# Altium footprint library Components_Footprints.PcbLib: 29 footprints (part 1 of 2)
Each footprint in its own frame and in the unit in brackets; x right, y up, seen from the top. Pads: shape width x height; smd on the part's side, far side on the other; paste and mask are expansions set on the pad; w line width, h text height; cw(c..) or ccw(c..) is an arc to the next point about the centre after c.
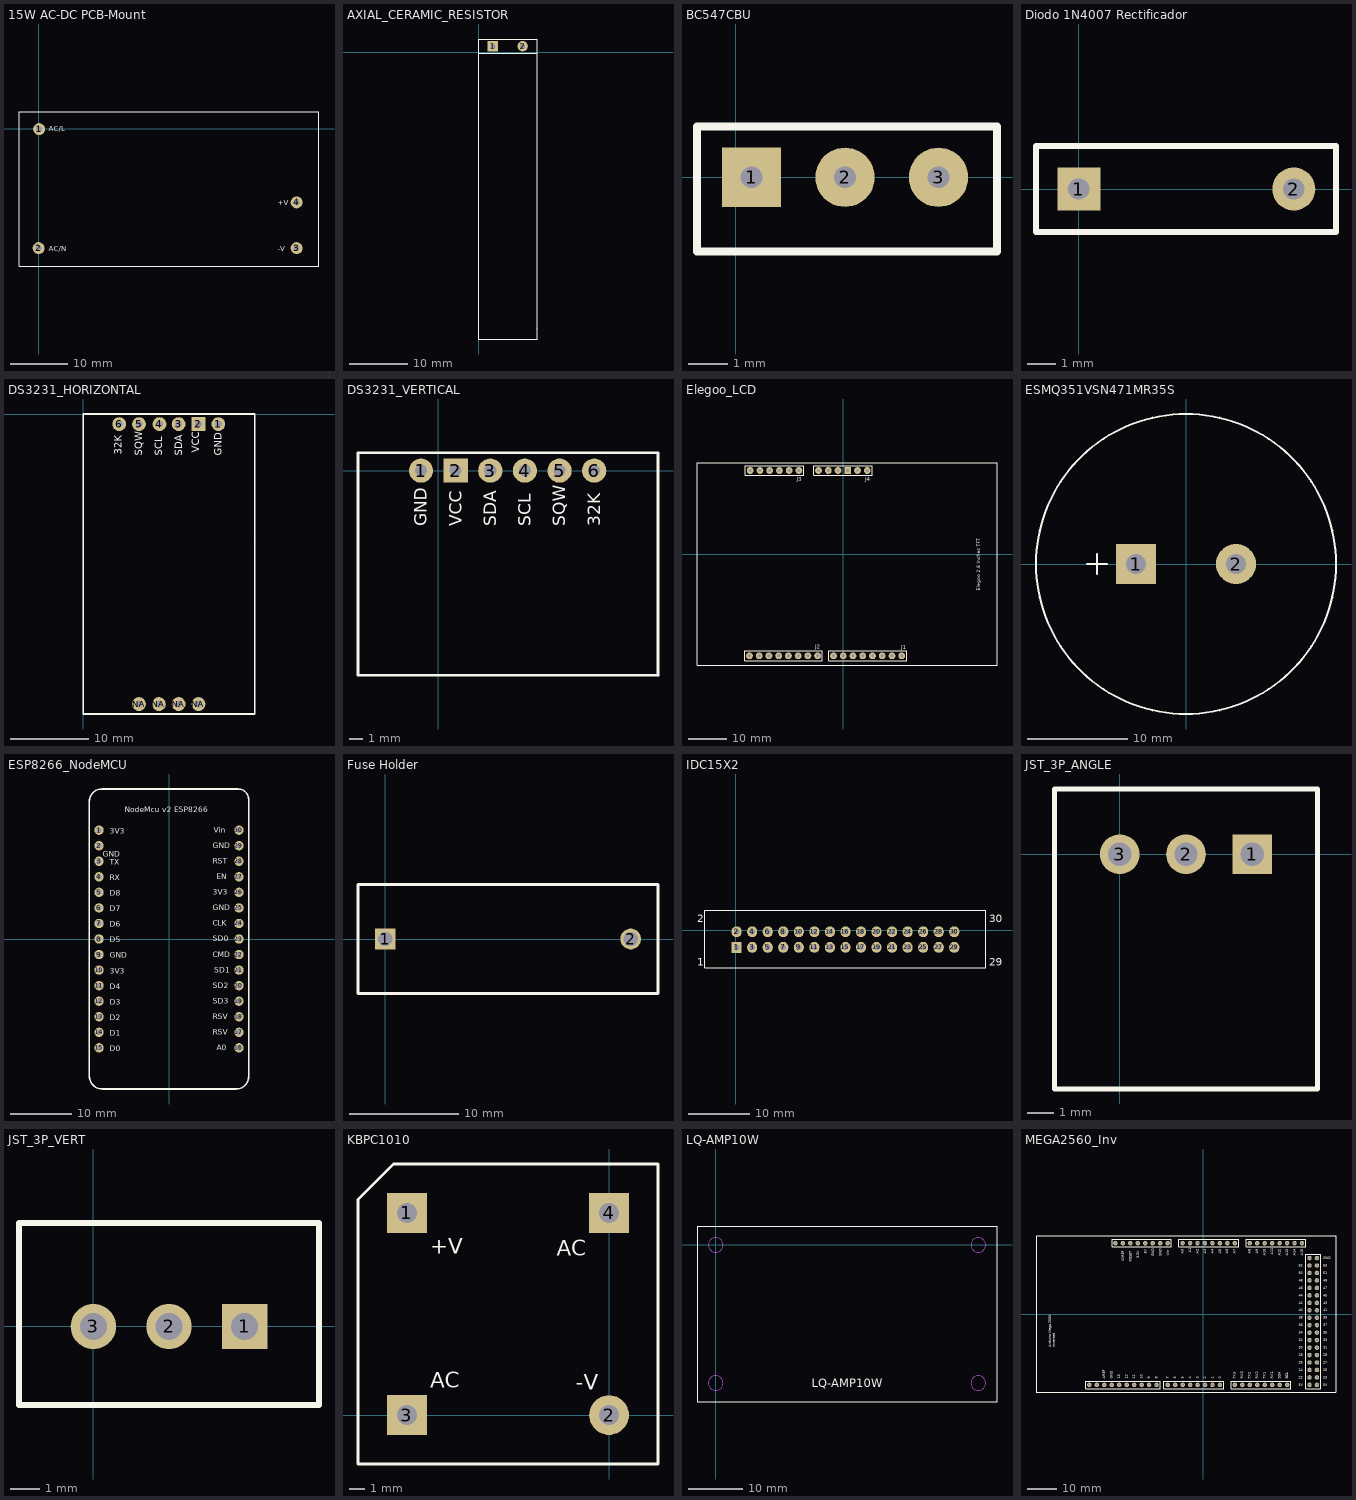
[diagram p0: the footprints below, top view; thin cyan lines are the x and y axes]

## 15W AC-DC PCB-Mount [mil]
height 944.88
pads (4):
  round 82 hole 41: 1(3.35,-1.1) 2(0,-820) 3(1775,-820) 4(1775,-505.04)
Top Overlay:
  lines w8: -135,-945.98 1929.13,-945.98 1929.13,120 -135,120 -135,-945.98
  text "+V" at 1645,-525 h36
  text "-V" at 1645,-840 h36
  text "AC/N" at 70,-840 h36
  text "AC/L" at 70,-15 h36
3D body "Mean Well IRM-20.stp": height 944.88, standoff -98.43, extent -133.86,-945.98 1929.13,124.88

## AXIAL_CERAMIC_RESISTOR [mil] "Axial Ceramic Resistor"
pads (2):
  rect 70x70 hole 35: 1(95.5,40.87)
  round 70 hole 35: 2(295.5,40.87)
Top Overlay:
  lines w8: 393,89.37 0,89.37 0,-5.63 ; 394,-10.63 394,89.37 ; 0,-5.63 0,-1929.13 393.7,-1929.13 393.7,-5.63 0,-5.63
Mechanical 1:
  lines w8: 392.01,-1856.02 393.7,-1854.33
3D body "RESAD5500W80L5000D930.stp": height 356.3, standoff -102.36, extent 16.93,-2028.42 383.07,168.43

## BC547CBU [mil]
pads (3):
  rect 60x60 hole 22.05: 1(15.75,0)
  round 60 hole 22.05: 2(110.24,0) 3(204.72,0)
Top Overlay:
  lines w8: -39.37,-74.8 263.78,-74.8 263.78,0 263.78,51.18 -39.37,51.18 -39.37,0 -39.37,-74.8
3D body "BC547.STEP": height 298.43, standoff -96.87, extent 1.19,-77.95 219.3,40.16

## Diodo 1N4007 Rectificador [mil]
pads (2):
  rect 60x60 hole 30: 1(0,0)
  round 60 hole 30: 2(300,0)
Top Overlay:
  lines w8: -60,-60 358.96,-60 358.96,60 -60,60 -60,-60
3D body "diode 1N4001.step": height 99.94, standoff -87.8, extent -10.16,-49 310.16,50.68

## DS3231_HORIZONTAL [mil]
height 393.7
pads (10):
  round 70 hole 35: 1(681.89,-51.18) 3(481.89,-51.18) 4(385,-51.18) 5(281.89,-51.18) 6(181.89,-51.18) NA(281.89,-1463.86) NA(381.89,-1463.86) NA(481.89,-1463.86) NA(581.89,-1463.86)
  rect 70x70 hole 35: 2(581.89,-51.18)
Top Overlay:
  lines w8: 0,-1513.86 866.14,-1513.86 866.14,0 0,0 0,-1513.86
  text "GND" at 698.89,-211.51 h36
  text "VCC" at 585,-195 h36
  text "SDA" at 498.89,-211.51 h36
  text "SCL" at 398.89,-211.51 h36
  text "SQW" at 298.89,-211.51 h36
  text "32K" at 195,-205 h36
Mechanical 1:
  lines w8: 866.14,-641.73 866.14,-641.73
3D body "4-Pin Header - Male - 2.54mm.step": height 405, standoff -65, extent 230,-1515.79 630,-1415.79
3D body "DS3231 Timer Assembly.stp": height 659.13, standoff -34.96, extent -30,-1504.72 828.27,4.72
3D body "6-Pin Header - Female - 2.54mm.step": height 196.85, standoff -118.11, extent 120.16,-98.43 739.84,0
3D body "4-Pin Header - Female - 2.54mm.step": height 196.85, standoff -118.11, extent 220.16,-1515 639.84,-1416.57

## DS3231_VERTICAL [mil] "RTC Module"
pads (6):
  round 70 hole 35: 1(-50.39,0) 3(149.61,0) 4(249.61,0) 5(349.61,0) 6(449.61,0)
  rect 70x70 hole 35: 2(49.61,0)
Top Overlay:
  lines w8: -232.28,-590.55 633.86,-590.55 633.86,51.18 -232.28,51.18 -232.28,-590.55
  text "32K" at 466.61,-160.33 h36
  text "SQW" at 366.61,-160.33 h36
  text "SCL" at 266.61,-160.33 h36
  text "SDA" at 166.61,-160.33 h36
  text "VCC" at 66.61,-160.33 h36
  text "GND" at -33.39,-161.31 h36
Mechanical 1:
  lines w8: 633.86,-590.55 633.86,-590.55
3D body "DS3231.step": height 1547.24, standoff -214.57, extent -248.03,-515.15 649.61,17.53

## Elegoo_LCD [mil]
pads (28):
  round 70 hole 35: 1(598.31,-1040.12) 2(498.31,-1040.12) 3(398.31,-1040.12) 4(298.31,-1040.12) 5(198.31,-1040.12) 6(98.31,-1040.12) 7(-1.69,-1040.12) 8(-101.69,-1040.12) 9(-264.69,-1040.12) 10(-364.69,-1040.12) 11(-464.69,-1040.12) 12(-564.69,-1040.12) 13(-664.69,-1040.12) 14(-764.69,-1040.12) 15(-864.69,-1040.12) 16(-964.69,-1040.12) 17(-956.81,862.24) 18(-856.81,862.24) 19(-756.81,862.24) 20(-656.81,862.24) 21(-556.81,862.24) 22(-456.81,862.24) 23(-255.24,862.24) 24(-155.24,862.24) 25(-55.24,862.24) 27(144.76,862.24) 28(244.76,862.24)
  rect 70x70 hole 35: 26(44.76,862.24)
Top Overlay:
  lines w8: -1502.87,-1135 -1502.87,939.8 1576.65,939.8 1576.65,-1135 -1502.87,-1135 ; -1014.69,-1090.12 -1014.69,-990.12 -214.69,-990.12 -214.69,-1090.12 -1014.69,-1090.12 ; -1006.81,812.24 -406.81,812.24 -406.81,912.24 -1006.81,912.24 -1006.81,812.24 ; -305.24,812.24 294.76,812.24 294.76,912.24 -305.24,912.24 -305.24,812.24 ; -151.69,-1090.12 -151.69,-990.12 648.31,-990.12 648.31,-1090.12 -151.69,-1090.12
  text "Elegoo 2.8 Inches TFT" at 1420,-372.38 h60
  text "J2" at -288.19,-968.94 h40
  text "J4" at 221.81,751.06 h40
  text "J3" at -478.19,751.06 h40
  text "J1" at 591.81,-973.94 h40
3D body "Female Pin Header 01x06 Pitch 2.54mm Height 8.5mm.stp": height 334.65, standoff -125.98, extent -1004.72,813.39 -404.72,913.39
3D body "Female Pin Header 01x06 Pitch 2.54mm Height 8.5mm.stp": height 334.65, standoff -125.98, extent -303.15,813.39 296.85,913.39
3D body "Female Pin Header 01x08 Pitch 2.54mm Height 8.5mm.stp": height 334.65, standoff -125.98, extent -1014.69,-1089.37 -214.69,-989.37
3D body "Female Pin Header 01x08 Pitch 2.54mm Height 8.5mm.stp": height 334.65, standoff -125.98, extent -151.69,-1089.37 648.31,-989.37
3D body "Elegoo_2.8_TFT_LCD_Display.stp": height 748.03, standoff 82.68, extent -1482.28,-1135.82 1600.39,946.86

## ESMQ351VSN471MR35S [mm] "CAP ALUM 470UF 20% 350V SNAP"
height 35
pads (2):
  rect 4x4 hole 2: 1(-5,0)
  round 4 hole 2: 2(5,0)
Top Overlay:
  circle w0.203: c0,0 r15
  lines w0.203: -9.89,0 -7.89,0 ; -8.89,-1 -8.89,1
3D body "Snap-Cap 30mm W x 35mm H 10mm pitch.step": height 35, standoff -6.2, extent -21.131,-21.131 21.132,21.132

## ESP8266_NodeMCU [mil]
pads (30):
  round 60 hole 35: 1(-450,700) 2(-450,600) 3(-450,500) 4(-450,400) 5(-450,300) 6(-450,200) 7(-450,100) 8(-450,0) 9(-450,-100) 10(-450,-200) 11(-450,-300) 12(-450,-400) 13(-450,-500) 14(-450,-600) 15(-450,-700) 16(450,-700) 17(450,-600) 18(450,-500) 19(450,-400) 20(450,-300) 21(450,-200) 22(450,-100) 23(450,0) 24(450,100) 25(450,200) 26(450,300) 27(450,400) 28(450,500) 29(450,600) 30(450,700)
Top Overlay:
  lines w10: 440.94,964.57 -433.07,964.57 ccw(c-433.07,885.83) -511.81,885.83 -511.81,-881.89 ccw(c-429.13,-881.89) -429.13,-964.57 433.07,-964.57 ccw(c433.07,-885.83) 511.81,-885.83 511.81,893.7 ; 444.88,964.57 cw(c444.88,897.64) 511.81,897.64
  text "NodeMcu v2 ESP8266" at -285,815 h36
  text "Vin" at 286.42,684 h36
  text "GND" at 282.49,584 h36
  text "RST" at 282.49,484 h36
  text "EN" at 306.1,384 h36
  text "3V3" at 282.49,284 h36
  text "GND" at 282.49,184 h36
  text "CLK" at 282.49,84 h36
  text "SD0" at 282.49,-16 h36
  text "CMD" at 282.49,-116 h36
  text "SD1" at 290.36,-216 h36
  text "SD2" at 282.49,-316 h36
  text "SD3" at 282.49,-416 h36
  text "RSV" at 282.49,-516 h36
  text "RSV" at 282.49,-616 h36
  text "A0" at 306.1,-716 h36
  text "D0" at -381,-722 h36
  text "D1" at -381,-622 h36
  text "D2" at -381,-522 h36
  text "D3" at -381,-422 h36
  text "D4" at -381,-322 h36
  text "3V3" at -381,-222 h36
  text "GND" at -381,-122 h36
  text "D5" at -381,-22 h36
  text "D6" at -381,78 h36
  text "D7" at -381,178 h36
  text "D8" at -381,278 h36
  text "RX" at -381,378 h36
  text "TX" at -381,478 h36
  text "GND" at -426,528 h36
  text "3V3" at -381,678 h36
3D body "15-Pin Header - Female - 2.54mm.step": height 196.85, standoff -118.11, extent 400.79,-759.84 499.21,759.85
3D body "15-Pin Header - Female - 2.54mm.step": height 196.85, standoff -118.11, extent -499.21,-759.84 -400.79,759.85
3D body "ESP8266.stp": height 505.63, standoff -49.1, extent -510,-952.05 495.9,970

## Fuse Holder [mm]
pads (2):
  rect 1.9x1.9 hole 1.3: 1(0,0)
  round 1.9 hole 1.3: 2(22.5,0)
Top Overlay:
  lines w0.254: -2.5,-5 -2.5,5 0,5 22.5,5 25,5 25,-5 22.5,-5 0,-5 -2.5,-5
3D body "FUSE-0031.8201.stp": height 11.5, standoff -4, extent -0.55,-4.8 22.55,4.8

## IDC15X2 [mil]
pads (30):
  rect 65x70 hole 35.43: 1(5,-110)
  oval 65x70 hole 35.43: 2(5,-10) 3(105,-110) 4(105,-10) 5(205,-110) 6(205,-10) 7(305,-110) 8(305,-10) 9(405,-110) 10(405,-10) 11(505,-110) 12(505,-10) 13(605,-110) 14(605,-10) 15(705,-110) 16(705,-10) 17(805,-110) 18(805,-10) 19(905,-110) 20(905,-10) 21(1005,-110) 22(1005,-10) 23(1105,-110) 24(1105,-10) 25(1205,-110) 26(1205,-10) 27(1305,-110) 28(1305,-10) 29(1405,-110) 30(1405,-10)
Top Overlay:
  lines w7.87: -198.54,-240 -198.54,127 1608.54,127 1608.54,-240 -198.54,-240
  text "29" at 1630,-230 h50
  text "30" at 1630,50 h50
  text "2" at -250,50 h50
  text "1" at -250,-230 h50
3D body "DS1013-30S (IDC-30MS CONNFLY).step": height 354.33, standoff -141.73, extent -197.54,-232.39 1609.54,118

## JST_3P_ANGLE [mil] "JST-XH Through Hole Right Angle Connectors"
height 240.16
pads (3):
  rect 60x60 hole 35.43: 1(200,0)
  round 60 hole 35.43: 2(100,0) 3(0,0)
Top Overlay:
  lines w8: -98.43,-354.33 -98.43,98.43 298.43,98.43 298.43,-354.33 -98.43,-354.33
3D body "S3B-XH-A.stp": height 240.16, standoff -133.86, extent -95,-361.38 294.77,91.38
3D body: height 10, standoff 0, extent 100,-70 100,-70

## JST_3P_VERT [mil] "JST-XH Through Hole Right Angle Connectors"
height 240.16
pads (3):
  rect 60x60 hole 35.43: 1(200,0)
  round 60 hole 35.43: 2(100,0) 3(0,0)
Top Overlay:
  lines w8: -98.43,-104 298.43,-104 298.43,137 -98.43,137 -98.43,-104
3D body: height 10, standoff 0, extent 100,-70 100,-70
3D body "JST - XH - Thru V - 3Pin - 2.54mm.stp": height 284, standoff -118, extent -91.99,-98 292.01,132

## KBPC1010 [mm] "Single-Phase Silicon Bridge Rectifier Rectifier"
pads (4):
  rect 2.6x2.6 hole 1.3: 1(-13.2,13.2) 3(-13.2,0) 4(0,13.2)
  round 2.6 hole 1.3: 2(0,0)
Top Overlay:
  lines w0.203: -16.4,-3.2 -16.4,14.08 -14.08,16.4 3.2,16.4 3.2,-3.2 ; -16.375,-3.2 3.175,-3.2
  text "-V" at -2.159,1.651 h1.02
  text "AC" at -11.684,1.778 h1.02
  text "AC" at -3.429,10.414 h1.02
  text "+V" at -11.684,10.541 h1.02
3D body "KBPC1010.step": height 9.5, standoff -17.1, extent -16.404,-3.323 3.196,16.277

## LQ-AMP10W [mil]
Top Overlay:
  lines w8: -135,-1135.04 -135,135.04 2035.04,135.04 2035.04,-1135.04 -135,-1135.04
  text "LQ-AMP10W" at 695.1,-1029.99 h60
Mechanical 1:
  circle w8: c0.04,-1000.04 r53.15
  circle w8: c1900.04,-1000 r53.15
  circle w8: c1900,0.04 r53.15
  circle w8: c0,-1000 r53.15
  circle w8: c1900,-1000 r53.15
  circle w8: c1900,0 r53.15
  circle w8: c0,0 r53.15

## MEGA2560_Inv [mil] "Arduino Mega 2560 Inverted"
pads (86):
  round 60 hole 35: 0(225,-949.39) 1(125,-949.39) 2(25,-949.39) 3(-75,-949.39) 3.3V(-875.94,949.39) 4(-175,-949.39) 5(-275,-949.39) 5V(-775.94,949.39) 5V_1(1425,-949.39) 5V_2(1525,-949.39) 6(-375,-949.39) 7(-475,-949.39) 8(-625,-949.39) 9(-725,-949.39) 10(-825,-949.39) 11(-925,-949.39) 12(-1025,-949.39) 13(-1125,-949.39) 22(1425,-849.39) 23(1525,-849.39) 24(1425,-749.39) 25(1525,-749.39) 26(1425,-649.39) 27(1525,-649.39) 28(1425,-549.39) 29(1525,-549.39) 30(1425,-449.39) 31(1525,-449.39) 32(1425,-349.39) 33(1525,-349.39) 34(1425,-249.39) 35(1525,-249.39) 36(1425,-149.39) 37(1525,-149.39) 38(1425,-49.39) 39(1525,-49.39) 40(1425,50.61) 41(1525,50.61) 42(1425,150.61) 43(1525,150.61) 44(1425,250.61) 45(1525,250.61) 46(1425,350.61) 47(1525,350.61) 48(1425,450.61) 49(1525,450.61) 50(1425,550.61) 51(1525,550.61) 52(1425,650.61) 53(1525,650.61) A0(-275.94,949.39) A1(-175.94,949.39) A2(-75.94,949.39) A3(24.06,949.39) A4(124.06,949.39) A5(224.06,949.39) A6(324.06,949.39) A7(424.06,949.39) A8(624.06,949.39) A9(724.06,949.39) A10(824.06,949.39) A11(924.06,949.39) A12(1024.06,949.39) A13(1124.06,949.39) A14(1224.06,949.39) A15(1324.06,949.39) AREF(-1325,-949.39) GND(-575.94,949.39) GND_1(-675.94,949.39) GND_2(-1225,-949.39) GND_3(1425,750.61) GND_4(1525,750.61) IOREF(-1075.94,949.39) LCD(-1425,-949.39) LCD_1(-1525,-949.39) NA(-1175.94,949.39) RESET(-975.94,949.39) RX1(925,-949.39) RX2(725,-949.39) RX3(525,-949.39) SCL(1125,-949.39) SDA(1025,-949.39) TX1(825,-949.39) TX2(625,-949.39) TX3(425,-949.39) Vin(-475.94,949.39)
Top Overlay:
  lines w8: 1374.06,699.39 1374.06,799.39 ; -2240,-1049.39 -2240,1050.61 1780,1050.61 1780,-1049.39 -2240,-1049.39 ; -1575.94,-999.39 -1575.94,-899.39 -575,-899.39 -575,-999.39 -1575.94,-999.39 ; -1220.94,899.39 -1220.94,999.39 -425.94,999.39 -425.94,899.39 -1220.94,899.39 ; -525,-999.39 -525,-899.39 275,-899.39 275,-999.39 -525,-999.39 ; -325.94,899.39 -325.94,999.39 474.06,999.39 474.06,899.39 -325.94,899.39 ; 375,-999.39 1175,-999.39 1175,-899.39 375,-899.39 375,-999.39 ; 574.06,899.39 574.06,999.39 1374.06,999.39 1374.06,899.39 574.06,899.39 ; 1375,-999.39 1375,800.61 1575,800.61 1575,-999.39 1375,-999.39
  text "Arduino Mega 2560  / Inverted" at -1985,-446.75 h36
  text "5V" at 1609.06,-965.61 h36
  text "53" at 1609.06,634.39 h36
  text "51" at 1609.06,534.39 h36
  text "49" at 1609.06,434.39 h36
  text "47" at 1609.06,334.39 h36
  text "45" at 1609.06,234.39 h36
  text "43" at 1609.06,134.39 h36
  text "41" at 1609.06,34.39 h36
  text "39" at 1609.06,-65.61 h36
  text "37" at 1609.06,-165.61 h36
  text "35" at 1609.06,-265.61 h36
  text "33" at 1609.06,-365.61 h36
  text "31" at 1609.06,-465.61 h36
  text "29" at 1609.06,-565.61 h36
  text "27" at 1609.06,-665.61 h36
  text "25" at 1609.06,-765.61 h36
  text "23" at 1609.06,-865.61 h36
  text "GND" at 1609.06,734.39 h36
  text "A15" at 1339.06,780.55 h36
  text "A14" at 1239.06,780.55 h36
  text "A13" at 1139.06,780.55 h36
  text "A12" at 1039.06,780.55 h36
  text "A11" at 939.06,792.55 h36
  text "A10" at 839.06,780.55 h36
  text "A9" at 739.06,810.54 h36
  text "A8" at 639.06,810.54 h36
  text "A0" at -260.94,810.54 h36
  text "A7" at 439.06,810.54 h36
  text "A6" at 339.06,810.54 h36
  text "A5" at 239.06,810.54 h36
  text "A4" at 139.06,810.54 h36
  text "A3" at 39.06,810.54 h36
  text "A2" at -60.94,810.54 h36
  text "A1" at -160.94,822.54 h36
  text "IOREF" at -1056.89,708.58 h36
  text "Vin" at -456.89,780.55 h36
  text "GND" at -556.89,774.56 h36
  text "GND" at -656.89,774.56 h36
  text "5V" at -756.89,810.54 h36
  text "3.3V" at -856.89,744.57 h36
  text "RESET" at -956.89,702.58 h36
  text "SCL" at 1139.06,-865.61 h36
  text "SCL" at 1139.06,-865.61 h36
  text "SDA" at 1039.06,-865.61 h36
  text "RX1" at 939.06,-865.61 h36
  text "TX1" at 839.06,-865.61 h36
  text "RX2" at 739.06,-865.61 h36
  text "TX2" at 639.06,-865.61 h36
  text "RX3" at 539.06,-865.61 h36
  text "TX3" at 439.06,-865.61 h36
  text "1" at 139.06,-865.61 h36
  text "2" at 39.06,-865.61 h36
  text "3" at -60.94,-865.61 h36
  text "4" at -160.94,-865.61 h36
  text "5" at -260.94,-865.61 h36
  text "6" at -360.94,-865.61 h36
  text "7" at -460.94,-865.61 h36
  text "0" at 239.06,-865.61 h36
  text "7" at -460.94,-865.61 h36
  text "9" at -710.94,-865.61 h36
  text "10" at -810.94,-865.61 h36
  text "11" at -910.94,-865.61 h36
  text "12" at -1010.94,-865.61 h36
  text "13" at -1110.94,-865.61 h36
  text "GND" at -1210.94,-865.61 h36
  text "AREF" at -1310.94,-865.61 h36
  text "8" at -610.94,-865.61 h36
  text "22" at 1284.06,-865.61 h36
  text "24" at 1284.06,-765.61 h36
  text "26" at 1284.06,-665.61 h36
  text "28" at 1284.06,-565.61 h36
  text "30" at 1284.06,-465.61 h36
  text "32" at 1284.06,-365.61 h36
  text "34" at 1284.06,-265.61 h36
  text "36" at 1284.06,-165.61 h36
  text "38" at 1284.06,-65.61 h36
  text "40" at 1284.06,34.39 h36
  text "42" at 1284.06,134.39 h36
  text "44" at 1284.06,234.39 h36
  text "46" at 1284.06,334.39 h36
  text "48" at 1284.06,434.39 h36
  text "50" at 1284.06,534.39 h36
  text "52" at 1284.06,634.39 h36
  text "5V" at 1284.06,-965.61 h36
3D body "18-Pin Header - Male - 2.54mm.step": height 120, standoff -350, extent 1474.99,-999.38 1574.99,800.62
3D body "18-Pin Header - Male - 2.54mm.step": height 120, standoff -350, extent 1374.99,-999.38 1474.99,800.62
3D body "10-Pin Header - Male - 2.54mm.step": height 120, standoff -350, extent -1574.99,-999.38 -574.99,-899.38
3D body "8-Pin Header - Male - 2.54mm.step": height 120, standoff -350, extent 375.01,-999.38 1175.01,-899.38
3D body "8-Pin Header - Male - 2.54mm.step": height 120, standoff -350, extent -524.99,-999.38 275.01,-899.38
3D body "8-Pin Header - Male - 2.54mm.step": height 120, standoff -350, extent -1225.94,899.4 -425.94,999.4
3D body "8-Pin Header - Male - 2.54mm.step": height 120, standoff -350, extent -325.94,899.4 474.06,999.4
3D body "8-Pin Header - Male - 2.54mm.step": height 120, standoff -350, extent 574.06,895.38 1374.06,995.38
3D body: height 385.83, standoff -385.83, extent -450,-1054.21 -100,-1054.21
3D body "MEGA2560.STEP": height 558.74, standoff -12.13, extent -2559.57,-1050 1705,1048.43